# Altium footprint library iMag.PcbLib: 77 footprints (part 1 of 5)
Each footprint in its own frame and in the unit in brackets; x right, y up, seen from the top. Pads: shape width x height; smd on the part's side, far side on the other; paste and mask are expansions set on the pad; w line width, h text height; cw(c..) or ccw(c..) is an arc to the next point about the centre after c.
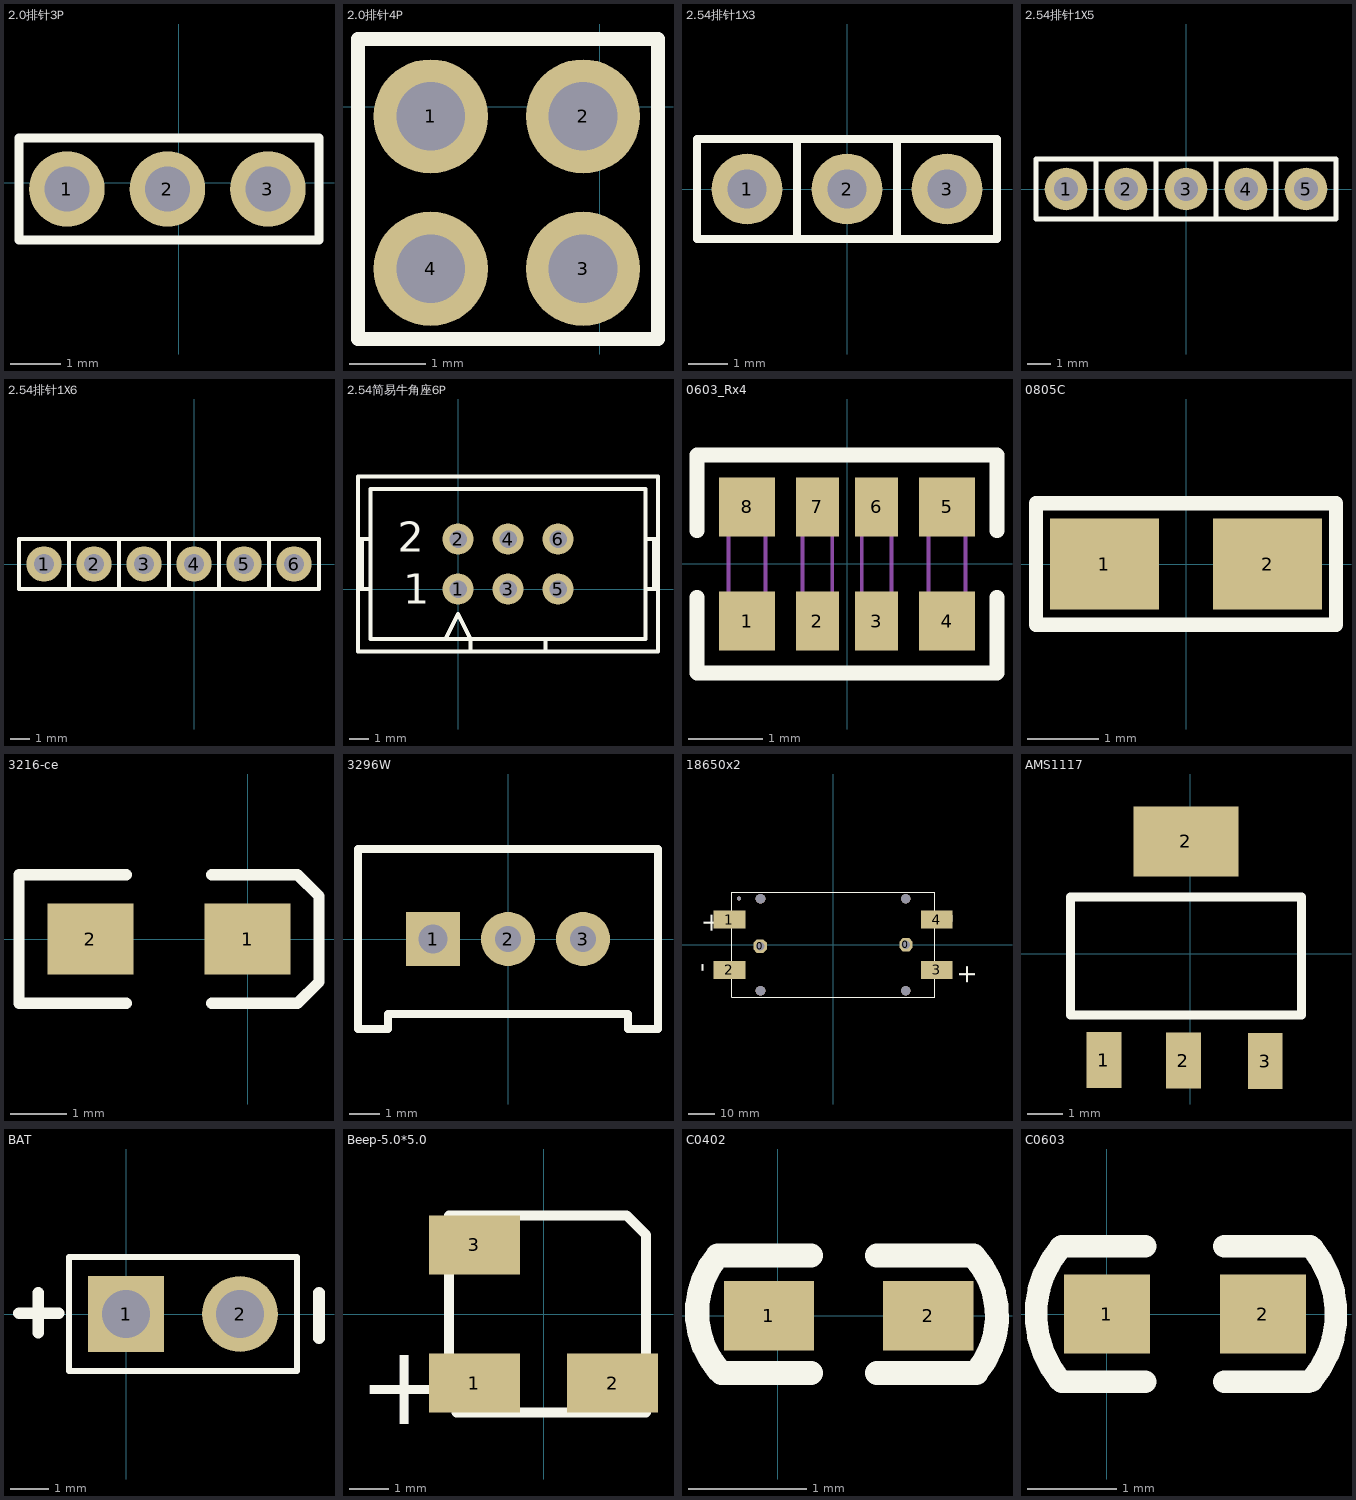
[diagram p0: the footprints below, top view; thin cyan lines are the x and y axes]

## 2.0排针3P [mm]
pads (3):
  round 1.5 hole 0.9: 1(-2.222,-0.127) 2(-0.222,-0.127) 3(1.778,-0.127)
Top Overlay:
  lines w0.178: -3.175,-1.143 2.794,-1.143 2.794,0.889 -3.175,0.889 -3.175,-1.143

## 2.0排针4P [mm]
pads (4):
  round 1.5 hole 0.9: 1(-2.222,-0.127) 2(-0.222,-0.127) 3(-0.222,-2.127) 4(-2.222,-2.127)
Top Overlay:
  lines w0.178: -3.175,-3.048 0.762,-3.048 0.762,0.889 -3.175,0.889 -3.175,-3.048

## 2.54排针1X3 [mm]
pads (3):
  round 1.8 hole 1: 1(-2.54,0) 2(0,0) 3(2.54,0)
Top Overlay:
  lines w0.2: -1.27,-1.27 -1.27,1.27 ; 1.27,-1.27 1.27,1.27 ; -3.81,-1.27 3.81,-1.27 3.81,1.27 -3.81,1.27 -3.81,-1.27
3D body "1001-3.STEP": height 2.5, standoff -9.04, extent -3.81,-1.27 3.81,1.27

## 2.54排针1X5 [mm]
pads (5):
  round 1.8 hole 1: 1(-5.08,0) 2(-2.54,0) 3(0,0) 4(2.54,0) 5(5.08,0)
Top Overlay:
  lines w0.2: -3.81,-1.27 -3.81,1.27 ; -1.27,-1.27 -1.27,1.27 ; 1.27,-1.27 1.27,1.27 ; 3.81,-1.27 3.81,1.27 ; -6.35,-1.27 -6.35,1.27 6.35,1.27 6.35,-1.27 -6.35,-1.27
3D body "1001-5.STEP": height 2.5, standoff -9.04, extent -6.35,-1.27 6.35,1.27

## 2.54排针1X6 [mm]
pads (6):
  round 1.8 hole 1: 1(-7.62,0) 2(-5.08,0) 3(-2.54,0) 4(0,0) 5(2.54,0) 6(5.08,0)
Top Overlay:
  lines w0.2: -6.35,-1.27 -6.35,1.27 ; -3.81,-1.27 -3.81,1.27 ; -1.27,-1.27 -1.27,1.27 ; 1.27,-1.27 1.27,1.27 ; 3.81,-1.27 3.81,1.27 ; -8.89,-1.27 6.35,-1.27 6.35,1.27 -8.89,1.27 -8.89,-1.27
3D body "1001-6.STEP": height 2.5, standoff -9.04, extent -8.89,-1.27 6.35,1.27

## 2.54简易牛角座6P [mil]
pads (6):
  round 62 hole 35: 1(0,0) 2(0,100) 3(100,0) 4(100,100) 5(200,0) 6(200,100)
Top Overlay:
  lines w8: -200,0 -175,0 ; -200,100 -175,100 ; -191.67,0 -191.67,100 ; -25,-100 0,-50 25,-100 ; 25,-125 25,-100 ; 125,-100 -175,-100 -175,200 375,200 375,-100 175,-100 ; 175,-125 175,-100 ; 375,0 400,0 ; 375,100 400,100 ; 391.67,0 391.67,100 ; 25,-100 175,-100 ; -200,-125 -200,225 400,225 400,-125 -200,-125
  text "2" at -121,75 h60
  text "1" at -110,-29 h60
3D body "User Library-IDC Socket Male 6pin Straight THT Goldplated 2_54mm.step": height 359.45, standoff -128.74, extent -199.61,-117.32 399.61,231.1

## 0603_Rx4 [mm] "贴片排阻"
height 1.1
pads (8):
  rect 0.75x0.8 smd mask+0.051: 1(-1.35,-0.77) 4(1.35,-0.77) 5(1.35,0.77) 8(-1.35,0.77)
  rect 0.58x0.8 smd mask+0.051: 2(-0.4,-0.77) 3(0.4,-0.77) 6(0.4,0.77) 7(-0.4,0.77)
Top Overlay:
  lines w0.2: -2.025,-0.45 -2.025,-1.47 2.025,-1.47 2.025,-0.45 ; -2.025,0.45 -2.025,1.47 2.025,1.47 2.025,0.45
Mechanical 13:
  lines w0.05: -1.6,-0.8 -1.6,0.8 -1.1,0.8 -1.1,-0.8 -1.6,-0.8 ; -0.6,-0.8 -0.6,0.8 -0.2,0.8 -0.2,-0.8 -0.6,-0.8 ; 0.2,-0.8 0.2,0.8 0.6,0.8 0.6,-0.8 0.2,-0.8 ; 1.1,-0.8 1.1,0.8 1.6,0.8 1.6,-0.8 1.1,-0.8
3D body "SW3dPS-RN164P.STEP": height 0.55, standoff 0, extent -1.6,-0.8 1.6,0.8

## 0805C [mil]
pads (2):
  rect 60x50 smd: 1(-45,0) 2(45,0)
Top Overlay:
  lines w7.87: -82.68,-33.46 -82.68,33.46 82.68,33.46 82.68,-33.46 -82.68,-33.46
3D body "User Library-cap_0805_lowprofile.step": height 37.4, standoff 0, extent -39.36,-23.62 39.37,23.63

## 3216-ce [mil]
pads (2):
  rect 60x50 smd: 1(0,0) 2(-110,0)
Top Overlay:
  lines w7.87: -85,-45 -160,-45 -160,45 -85,45 ; -25,-45 35,-45 50,-30 50,30 35,45 -25,45
3D body "User Library-AVX_ACASE.STEP": height 67.32, standoff 0, extent -121.93,-31.14 11.93,35

## 3296W [mm]
pads (3):
  rect 1.8x1.8 hole 0.95: 1(-2.5,0)
  round 1.8 hole 0.85: 2(0,0) 3(2.5,0)
Top Overlay:
  lines w0.254: -5,-3 -4,-3 -4,-2.5 4,-2.5 4,-3 5,-3 5,3 -5,3 -5,-3
3D body "User Library-3296W.step": height 11.55, standoff -1.6, extent -4.765,-2.4 4.765,2.4

## 18650x2 [mm] "2节电池座"
pads (6):
  oct 5.08x5.08 hole 3.2: 0(-27.7,-0.508) 0(27.7,0)
  rect 12x6.9 smd: 1(-39.35,9.55) 2(-39.35,-9.55) 3(39.35,-9.55) 4(39.35,9.55)
via -27.6,17.5 diameter 3.7 hole 3.7
via -27.6,-17.5 diameter 3.7 hole 3.7
via -35.687,17.526 diameter 1.6 hole 1.6
via 27.6,17.5 diameter 3.7 hole 3.7
via 27.6,-17.5 diameter 3.7 hole 3.7
Top Overlay:
  lines w0.3: -38.55,-19.95 -38.55,19.95 38.55,19.95 38.55,-19.95 -38.55,-19.95
  text "+" at -51.689,12.319 h12
  text "+" at 45.466,-7.239 h12
  text "-" at 50.292,8.255 h12
  text "-" at -44.45,-10.541 h12
3D body "User Library-Blossom 1048.STEP": height 15.03, standoff -1.38, extent -43.129,-19.888 42.875,19.888

## AMS1117 [mm]
pads (4):
  rect 1x1.6 smd: 1(-2.475,-3.041) 2(-0.2,-3.058) 3(2.142,-3.071)
  rect 3x2 smd: 2(-0.129,3.216)
Top Overlay:
  lines w0.254: -3.429,-1.753 -3.429,1.626 3.175,1.626 3.175,-1.753 -3.429,-1.753
3D body "AMS1117.STEP": height 1.85, standoff -0.05, extent -3.479,-3.685 3.221,3.519

## BAT [mm]
pads (2):
  rect 2x2 hole 1.27: 1(0,0)
  round 2 hole 1.27: 2(3,0)
Top Overlay:
  lines w0.152: -1.5,-1.5 4.5,-1.5 4.5,1.5 -1.5,1.5 -1.5,-1.5
  lines w0.305: -2.819,0.023 -1.769,0.023 ; -2.314,-0.492 -2.314,0.559 ; 5.08,-0.641 5.08,0.559

## Beep-5.0*5.0 [mm]
pads (3):
  rect 2.3x1.5 smd: 1(-1.75,-1.75) 2(1.75,-1.75) 3(-1.75,1.75)
Top Overlay:
  lines w0.254: -2.4,-2.301 -2.4,2.499 2.101,2.499 2.6,2 2.6,-2.501 -2.2,-2.501
  text "+" at -4.699,-2.794 h2.03
3D body: height 2, standoff 0, extent -2.413,-2.54 2.667,2.54

## C0402 [mil]
pads (2):
  rect 30x23 smd: 1(-3,0) 2(50,0)
Top Overlay:
  lines w8: 11,-19 -18.77,-19 -19.99,-17.78 cw(c2.37,1.12) -20,20 11,20 ; 33,-19 65.95,-19 ; 33,20 65,20 cw(c43.58,0.05) 65.95,-18.84
3D body "cap_0402.STEP": height 19.68, standoff 0, extent 2.31,-10 41.69,9.69

## C0603 [mil]
pads (2):
  rect 38x35 smd: 1(0,0) 2(69,0)
Top Overlay:
  lines w10: -21,-29 cw(c14.45,-0.04) -20.48,29.56 ; -20,-30 17,-30 ; -20,30 17,30 ; 52,-30 89,-30 ; 52,30 90,30 ; 90.48,-29.56 ccw(c55.55,0.04) 91,29
3D body "User Library-0603 SMD Capacitor.STEP": height 11.89, standoff 0, extent 3.8,-15.8 66.8,15.7